# Altium footprint library SparkFun-Connectors.PCBLIB: 409 footprints (part 24 of 26)
Each footprint in its own frame and in the unit in brackets; x right, y up, seen from the top. Pads: shape width x height; smd on the part's side, far side on the other; paste and mask are expansions set on the pad; w line width, h text height; cw(c..) or ccw(c..) is an arc to the next point about the centre after c.
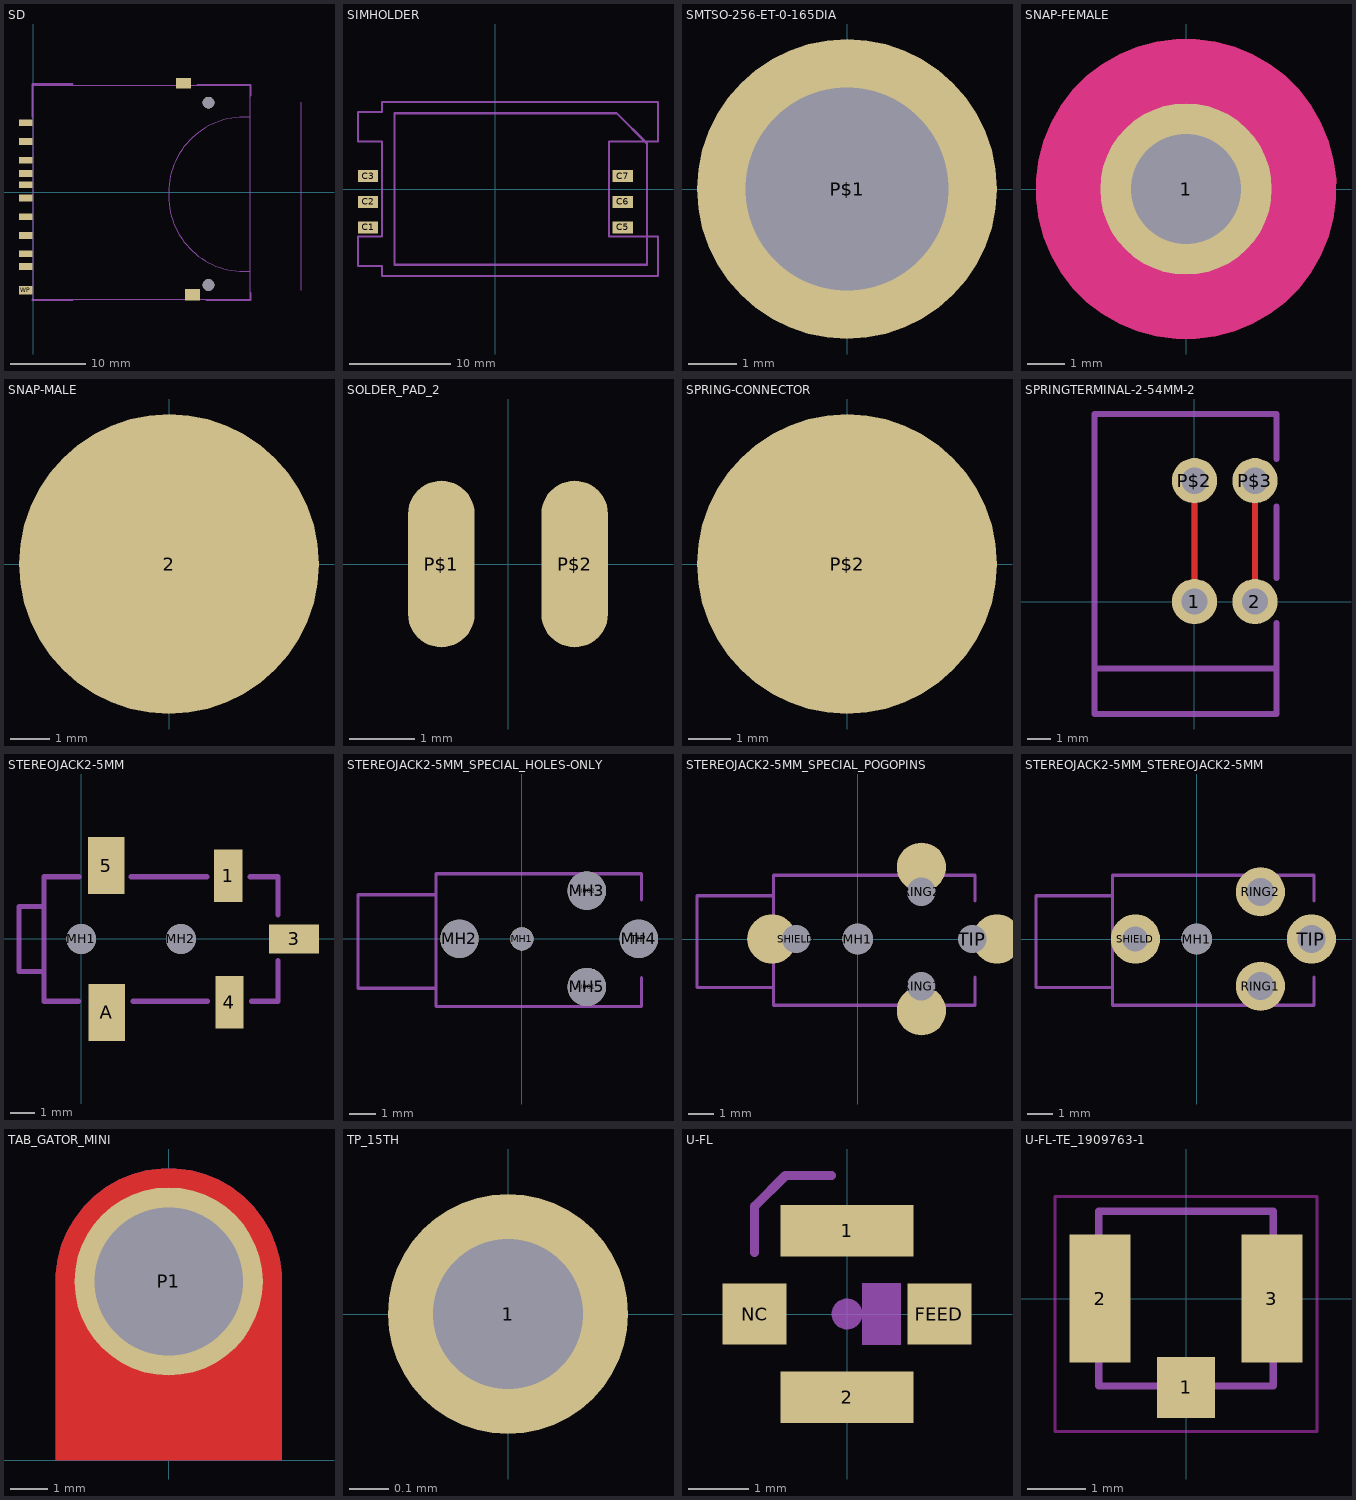
[diagram p23: the footprints below, top view; thin cyan lines are the x and y axes]

## SD [mm]
pads (15):
  rect 1.8x0.9 smd: 1(-1,6.77) 2(-1,4.27) 3(-1,2.52) 4(-1,-0.73) 5(-1,-3.23) 6(-1,-5.73) 7(-1,-8.15) 8(-1,-9.85) 9(-1,9.27) CD(-1,1.02)
  round 1.55 hole 1.55 unplated: MH1(23.3,11.94) MH2(23.3,-12.32)
  rect 2x1.4 smd: SH@1(20,14.496)
  rect 2x1.527 smd: SH@2(21.15,-13.589)
  rect 1.8x1.1 smd: WP(-1,-13)
tDocu:
  lines w0.127: 35.6,-13 35.6,12 ; 28.8,-10.5 28.8,10 ; 28.8,-10.5 28.8,-14.25 0,-14.25 0,14.25 28.8,14.25 28.8,10 ; 28.8,-10.5 28,-10.5 cw(c28,-0.5) 18,-0.5 18,0 cw(c28,0) 28,10 28.8,10
  text "card lock position" at 34.9,-9.3 h1.97
tPlace:
  lines w0.254: -0.095,-14.238 -0.095,-14.327 5.239,-14.327 ; -0.095,10.019 -0.095,14.418 5.239,14.418 ; 21.849,14.318 28.888,14.318 28.9,12.9 ; 23.011,-14.327 28.888,-14.327 28.888,-13.349

## SIMHOLDER [mm]
pads (6):
  rect 2x1.2 smd: C1(-12.61,-3.81) C2(-12.61,-1.27) C3(-12.61,1.27) C5(12.61,-3.81) C6(12.61,-1.27) C7(12.61,1.27)
tDocu:
  lines w0.203: -10,-7.5 -10,7.5 12,7.5 15,4.5 15,-7.5 -10,-7.5
tPlace:
  lines w0.203: -13.61,-7.625 -13.61,-4.7 -11.25,-4.7 -11.25,4.7 -13.61,4.7 -13.61,7.625 -11.25,7.625 -11.25,8.6 16.09,8.6 16.09,4.7 11.25,4.7 11.25,-4.7 16.09,-4.7 16.09,-8.6 -11.25,-8.6 -11.25,-7.625 -13.61,-7.625

## SMTSO-256-ET-0-165DIA [mil]
pads (1):
  round 244 hole 165: P$1(0,0)
Top Paste:
  lines w40: -90,-40 ccw(c0,0) -40,-90 ; -90,40 cw(c0,0) -40,90 ; 40,-90 ccw(c0,0) 90,-40 ; 40,90 cw(c0,0) 90,40
tDocu:
  circle w5: c0,0 r40

## SNAP-FEMALE [mil]
pads (1):
  round 180 hole 115: 1(0,0)
Top:
  region: -157.5,0 -157.5,10.32 -154.8,30.79 -149.46,50.73 -141.56,69.81 -131.24,87.69 -118.67,104.07 -104.07,118.67 -87.69,131.24 -69.81,141.56 -50.73,149.46 -30.79,154.8 -10.32,157.5 0,157.5 10.32,157.5 30.79,154.81 50.74,149.46 69.81,141.56 87.69,131.24 104.07,118.67 118.67,104.07 131.24,87.69 141.56,69.81 149.46,50.74 154.81,30.79 157.5,10.32 157.5,0 157.5,-10.32 154.8,-30.79 149.46,-50.73 141.56,-69.81 131.24,-87.69 118.67,-104.07 104.07,-118.67 87.69,-131.24 69.81,-141.56 50.73,-149.46 30.79,-154.8 10.32,-157.5 0,-157.5 -10.32,-157.5 -30.79,-154.8 -50.73,-149.46 -69.81,-141.56 -87.69,-131.24 -104.07,-118.67 -118.67,-104.07 -131.24,-87.69 -141.56,-69.81 -149.46,-50.73 -154.8,-30.79 -157.5,-10.32 -157.5,0
Top keep-out:
  region: -157.5,0 -157.5,10.32 -154.8,30.79 -149.46,50.73 -141.56,69.81 -131.24,87.69 -118.67,104.07 -104.07,118.67 -87.69,131.24 -69.81,141.56 -50.73,149.46 -30.79,154.8 -10.32,157.5 0,157.5 10.32,157.5 30.79,154.81 50.74,149.46 69.81,141.56 87.69,131.24 104.07,118.67 118.67,104.07 131.24,87.69 141.56,69.81 149.46,50.74 154.81,30.79 157.5,10.32 157.5,0 157.5,-10.32 154.8,-30.79 149.46,-50.73 141.56,-69.81 131.24,-87.69 118.67,-104.07 104.07,-118.67 87.69,-131.24 69.81,-141.56 50.73,-149.46 30.79,-154.8 10.32,-157.5 0,-157.5 -10.32,-157.5 -30.79,-154.8 -50.73,-149.46 -69.81,-141.56 -87.69,-131.24 -104.07,-118.67 -118.67,-104.07 -131.24,-87.69 -141.56,-69.81 -149.46,-50.73 -154.8,-30.79 -157.5,-10.32 -157.5,0
Top Paste:
  region: -157.5,0 -157.5,10.32 -154.8,30.79 -149.46,50.73 -141.56,69.81 -131.24,87.69 -118.67,104.07 -104.07,118.67 -87.69,131.24 -69.81,141.56 -50.73,149.46 -30.79,154.8 -10.32,157.5 0,157.5 10.32,157.5 30.79,154.81 50.74,149.46 69.81,141.56 87.69,131.24 104.07,118.67 118.67,104.07 131.24,87.69 141.56,69.81 149.46,50.74 154.81,30.79 157.5,10.32 157.5,0 157.5,-10.32 154.8,-30.79 149.46,-50.73 141.56,-69.81 131.24,-87.69 118.67,-104.07 104.07,-118.67 87.69,-131.24 69.81,-141.56 50.73,-149.46 30.79,-154.8 10.32,-157.5 0,-157.5 -10.32,-157.5 -30.79,-154.8 -50.73,-149.46 -69.81,-141.56 -87.69,-131.24 -104.07,-118.67 -118.67,-104.07 -131.24,-87.69 -141.56,-69.81 -149.46,-50.73 -154.8,-30.79 -157.5,-10.32 -157.5,0
Top Solder:
  region: -157.5,0 -157.5,10.32 -154.81,30.79 -149.46,50.74 -141.56,69.81 -131.24,87.69 -118.67,104.07 -104.07,118.67 -87.69,131.24 -69.81,141.56 -50.74,149.46 -30.79,154.81 -10.32,157.5 0,157.5 10.32,157.5 30.79,154.81 50.74,149.46 69.81,141.56 87.69,131.24 104.07,118.67 118.67,104.07 131.24,87.69 141.56,69.81 149.46,50.74 154.81,30.79 157.5,10.32 157.5,0 157.5,-10.32 154.8,-30.79 149.46,-50.73 141.56,-69.81 131.24,-87.69 118.67,-104.07 104.07,-118.67 87.69,-131.24 69.81,-141.56 50.73,-149.46 30.79,-154.8 10.32,-157.5 0,-157.5 -10.32,-157.5 -30.79,-154.8 -50.73,-149.46 -69.81,-141.56 -87.69,-131.24 -104.07,-118.67 -118.67,-104.07 -131.24,-87.69 -141.56,-69.81 -149.46,-50.73 -154.8,-30.79 -157.5,-10.32 -157.5,0

## SNAP-MALE [mil]
pads (1):
  rrect100% 300x300 smd: 2(0,0)

## SOLDER_PAD_2 [mil]
pads (2):
  rrect100% 40x100 smd paste+0: P$1(-40,0) P$2(40,0)

## SPRING-CONNECTOR [mil]
pads (1):
  rrect100% 280x280 smd: P$2(0,0)

## SPRINGTERMINAL-2-54MM-2 [mil]
pads (4):
  round 74.8 hole 43.31: 1(0,0) 2(100,0) P$2(0,200) P$3(100,200)
Top:
  lines w10: 0,0 0,200 ; 100,0 100,200
Bottom:
  lines w10: 0,0 0,200 ; 100,0 100,200
tDocu:
  lines w10: -165.35,-110.24 -165.35,-185.83 135.43,-185.83 135.43,-110.24
tPlace:
  lines w10: 135.43,-35.43 135.43,-110.24 -165.35,-110.24 -165.35,310.24 135.43,310.24 135.43,236.22 ; 135.43,39.37 135.43,157.48

## STEREOJACK2-5MM [mm]
pads (7):
  rect 1.145x2.1 smd: 1(5.898,2.54)
  rect 1.998x1.17 smd: 3(8.55,0)
  rect 1.119x2.1 smd: 4(5.949,-2.54)
  rect 1.467x2.3 smd: 5(1,2.951) A(1.016,-2.951)
  round 1.2 hole 1.2 unplated: MH1(0,0) MH2(4,0)
tPlace:
  lines w0.203: -0.121,-2.5 -1.5,-2.5 -1.5,-1.3 ; -0.096,2.5 -1.5,2.5 -1.5,1.3 ; 1.996,2.5 5.052,2.5 ; 2.073,-2.5 5.077,-2.5 ; 6.773,2.5 7.9,2.5 7.9,0.974 ; 6.848,-2.5 7.9,-2.5 7.9,-0.873 ; -1.5,-1.3 -1.5,1.3 ; -1.5,-1.3 -2.5,-1.3 -2.5,1.3 -1.5,1.3

## STEREOJACK2-5MM_SPECIAL_HOLES-ONLY [mil]
pads (9):
  round 35 hole 35 unplated: MH1(0,0)
  round 58 hole 58 unplated: MH2(-94.49,0) MH3(98.43,72.83) MH4(177.17,0) MH5(98.43,-72.83)
  round 35 hole 35: RING1(98.43,-72.83) RING2(98.43,72.83) SHIELD(-94.49,0) TIP(177.17,0)
tPlace:
  lines w5: 181.1,-59.06 181.1,-102.36 -129.92,-102.36 -129.92,-74.8 ; 181.1,59.06 181.1,98.43 -129.92,98.43 -129.92,66.93 ; -129.92,-74.8 -129.92,66.93 ; -129.92,-74.8 -248.03,-74.8 -248.03,66.93 -129.92,66.93

## STEREOJACK2-5MM_SPECIAL_POGOPINS [mil]
pads (5):
  round 47.24 hole 47.24 unplated: MH1(0,0)
  round 76 hole 44 copper offset 0,-38: RING1(98.43,-72.83)
  round 76 hole 44 copper offset 0,38: RING2(98.43,72.83)
  round 76 hole 44 copper offset -38,0: SHIELD(-94.49,0)
  round 76 hole 44 copper offset 38,0: TIP(177.17,0)
tPlace:
  lines w5: 181.1,-59.06 181.1,-102.36 -129.92,-102.36 -129.92,-74.8 ; 181.1,59.06 181.1,98.43 -129.92,98.43 -129.92,66.93 ; -129.92,-74.8 -129.92,66.93 ; -129.92,-74.8 -248.03,-74.8 -248.03,66.93 -129.92,66.93

## STEREOJACK2-5MM_STEREOJACK2-5MM [mil]
pads (5):
  round 47.24 hole 47.24 unplated: MH1(0,0)
  round 76 hole 43.31: RING1(98.43,-72.83) RING2(98.43,72.83) TIP(177.17,0)
  round 76 hole 39.37: SHIELD(-94.49,0)
tPlace:
  lines w5: 181.1,-59.06 181.1,-102.36 -129.92,-102.36 -129.92,-74.8 ; 181.1,59.06 181.1,98.43 -129.92,98.43 -129.92,66.93 ; -129.92,-74.8 -129.92,66.93 ; -129.92,-74.8 -248.03,-74.8 -248.03,66.93 -129.92,66.93

## TAB_GATOR_MINI [mil]
pads (1):
  round 200 hole 157.5: P1(0,190)
Top:
  region: 0,310 -7.87,310 -23.46,307.95 -38.66,303.88 -53.19,297.86 -66.81,289.99 -79.29,280.41 -90.41,269.29 -99.99,256.81 -107.86,243.19 -113.88,228.66 -117.95,213.46 -120,197.87 -120,190 -120,0 120,0 120,190 120,197.87 117.95,213.46 113.88,228.66 107.86,243.19 99.99,256.81 90.41,269.29 79.29,280.41 66.81,289.99 53.19,297.86 38.66,303.88 23.46,307.95 7.87,310 0,310
Bottom:
  region: 0,310 -7.87,310 -23.46,307.95 -38.66,303.88 -53.19,297.86 -66.81,289.99 -79.29,280.41 -90.41,269.29 -99.99,256.81 -107.86,243.19 -113.88,228.66 -117.95,213.46 -120,197.87 -120,190 -120,0 120,0 120,190 120,197.87 117.95,213.46 113.88,228.66 107.86,243.19 99.99,256.81 90.41,269.29 79.29,280.41 66.81,289.99 53.19,297.86 38.66,303.88 23.46,307.95 7.87,310 0,310
Top Solder:
  region: 124,-4 -124,-4 -124,196 -124.27,204.02 -122.53,219.97 -118.54,235.51 -112.4,250.34 -104.23,264.14 -94.18,276.65 -82.46,287.61 -69.31,296.81 -54.99,304.05 -39.79,309.19 -24.01,312.12 -7.98,312.8 0,312 7.73,312.39 23.17,311.15 38.32,307.91 52.91,302.72 66.7,295.66 79.45,286.87 90.94,276.49 100.98,264.7 109.4,251.69 116.04,237.7 120.81,222.97 123.61,207.73 124,200
Bottom Solder:
  region: 125,-2 -123,-2 -123,198 -123.27,206.02 -121.53,221.97 -117.54,237.51 -111.4,252.34 -103.23,266.14 -93.18,278.65 -81.46,289.61 -68.31,298.81 -53.99,306.05 -38.79,311.19 -23.01,314.12 -6.98,314.8 1,314 8.73,314.39 24.17,313.15 39.32,309.91 53.91,304.72 67.7,297.66 80.45,288.87 91.94,278.49 101.98,266.7 110.4,253.69 117.04,239.7 121.81,224.97 124.61,209.73 125,202

## TP_15TH [mil]
pads (1):
  round 24 hole 15: 1(0,0)
Bottom Solder:
  circle w0: c0,0 r15

## U-FL [mm]
pads (4):
  rect 2.2x0.85 smd: 1(0,1.375) 2(0,-1.375)
  rect 1.05x1 smd: FEED(1.525,0) NC(-1.525,0)
tPlace:
  circle w0.254: c0,0 r0.127
  region: 0.889,-0.508 0.889,0.508 0.254,0.508 0.254,-0.508
  lines w0.152: -1.524,1.016 -1.524,1.778 -1.016,2.286 -0.254,2.286

## U-FL-TE_1909763-1 [mm]
pads (3):
  rect 1x1.05 smd: 1(0,-1.525)
  rect 1.05x2.2 smd: 2(-1.475,0) 3(1.475,0)
Top keep-out:
  lines w0.05: -2.25,-2.28 2.25,-2.28 2.25,1.75 -2.25,1.75 -2.25,-2.28
tDocu:
  lines w0.127: -1.5,-1.5 1.5,-1.5 1.5,1.5 -1.5,1.5 -1.5,-1.5
tPlace:
  lines w0.127: -1.5,1.5 1.5,1.5